# Altium footprint library 元件1.PcbLib: 420 footprints (part 16 of 27)
Each footprint in its own frame and in the unit in brackets; x right, y up, seen from the top. Pads: shape width x height; smd on the part's side, far side on the other; paste and mask are expansions set on the pad; w line width, h text height; cw(c..) or ccw(c..) is an arc to the next point about the centre after c.
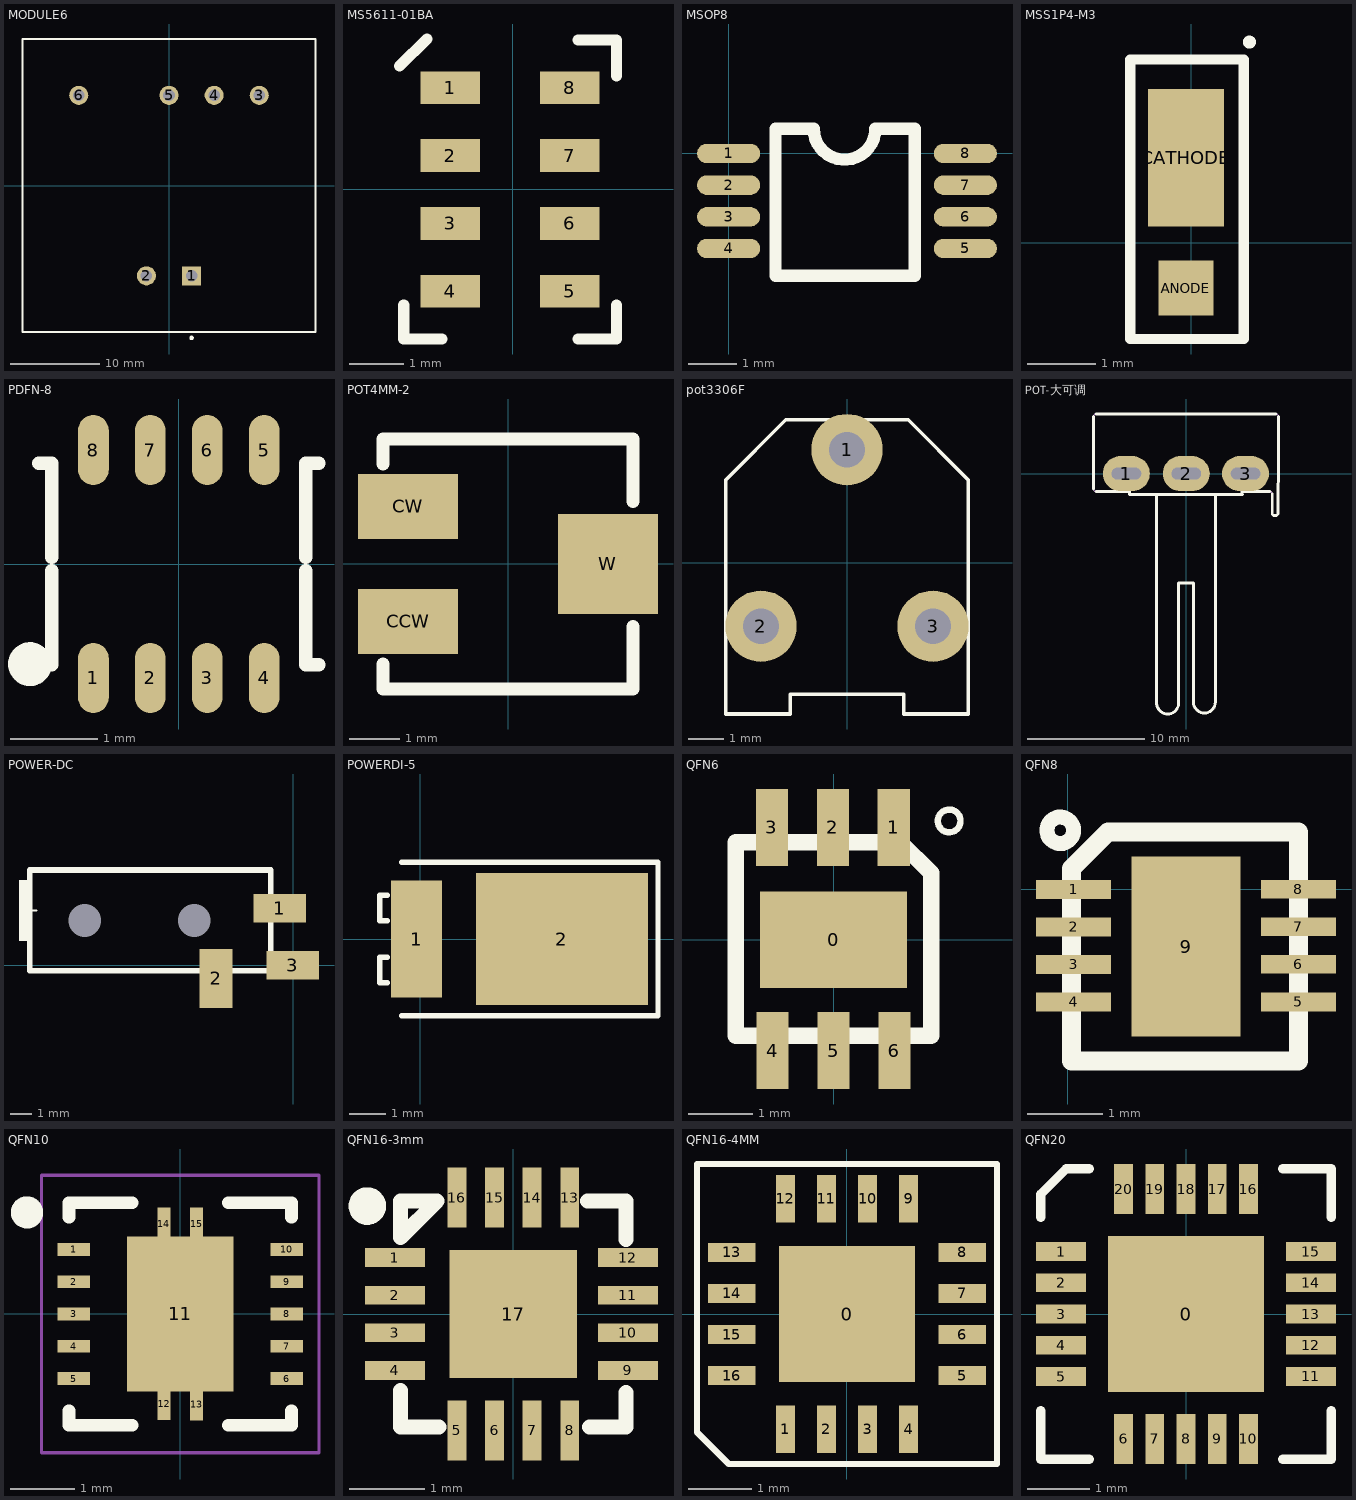
[diagram p15: the footprints below, top view; thin cyan lines are the x and y axes]

## MODULE6 [mm] "DIP; 6 Round Pins; Row Space 20.32 mm; Pitch 2.54 mm"
height 16.5
pads (6):
  rect 2.15x2.15 hole 1.3: 1(2.54,-10.16)
  round 2.15 hole 1.3: 2(-2.54,-10.16) 3(10.16,10.16) 4(5.08,10.16) 5(0,10.16) 6(-10.16,10.16)
Top Overlay:
  circle w0.25: c2.54,-17.15 r0.125
  lines w0.2: -16.5,-16.5 16.5,-16.5 16.5,16.5 -16.5,16.5 -16.5,-16.5
3D body "MODULE6.STEP": height 10, standoff 0, extent -16.602,-16.363 16.398,16.637

## MS5611-01BA [mm] "BAROMETER"
pads (8):
  rect 1.1x0.6 smd: 1(-1.153,1.867) 2(-1.153,0.617) 3(-1.153,-0.633) 4(-1.153,-1.883) 5(1.047,-1.883) 6(1.047,-0.633) 7(1.047,0.617) 8(1.047,1.867)
Top Overlay:
  lines w0.203: -2.083,2.261 -1.583,2.761 ; -2.007,-2.134 -2.007,-2.758 -1.303,-2.758 ; 1.197,-2.758 1.905,-2.758 1.905,-2.134 ; 1.197,2.742 1.905,2.742 1.905,2.083
3D body "User Library-MS5611-01BA03.STEP": height 1, standoff -0.05, extent -1.55,-2.54 1.45,2.46

## MSOP8 [mm] "VSOP8"
pads (8):
  oval 1.3x0.4 smd: 1(0,0) 2(0,-0.652) 3(0,-1.304) 4(0,-1.956) 5(4.877,-1.956) 6(4.877,-1.304) 7(4.877,-0.652) 8(4.877,0)
Top Overlay:
  lines w0.254: 0.965,-2.515 3.835,-2.515 3.835,0.508 3.023,0.508 cw(c2.388,0.508) 1.753,0.508 0.965,0.508 0.965,-2.515
3D body "SW3dPS-MSOP8.STEP": height 1.05, standoff -0.05, extent -0.03,-2.54 4.907,0.56

## MSS1P4-M3 [mm] "DIODE-SCHOTTKY_MSMP"
pads (2):
  rect 0.8x0.8 smd: ANODE(-0.078,-0.658)
  rect 1.1x2 smd: CATHODE(-0.078,1.242)
Top Overlay:
  circle w0.1: c0.844,2.921 r0.045
  lines w0.15: -0.889,-1.397 0.762,-1.397 0.762,2.667 -0.889,2.667 -0.889,-1.397
3D body "User Library-MicroSMP-2.STEP": height 0.73, standoff 0, extent -0.76,-0.79 0.64,1.91

## PDFN-8 [mm]
height 0.9
pads (8):
  oval 0.35x0.8 smd: 1(-0.975,-1.3) 2(-0.325,-1.3) 3(0.325,-1.3) 4(0.975,-1.3) 5(0.975,1.3) 6(0.325,1.3) 7(-0.325,1.3) 8(-0.975,1.3)
Top Overlay:
  circle w0.25: c-1.7,-1.143 r0.125
  lines w0.152: -1.6,1.15 -1.45,1.15 -1.45,0.075 ; -1.45,-1.15 -1.45,-0.075 ; 1.45,-0.075 1.45,-1.15 1.6,-1.15 ; 1.45,0.075 1.45,1.15 1.6,1.15
3D body "PDFN-8.STEP": height 0.9, standoff 0, extent -1.549,-1.4 1.551,1.4

## POT4MM-2 [mm] "Square Trimming Potentiometer"
pads (3):
  rect 2x1.3 smd: CCW(-2,-1.15) CW(-2,1.15)
  rect 2x2 smd: W(2,0)
Top Overlay:
  lines w0.254: -2.5,-2 -2.5,-2.5 2.5,-2.5 2.5,-1.25 ; -2.5,2 -2.5,2.5 2.5,2.5 2.5,1.25
3D body "POT4MM-2.STEP": height 5.5, standoff 0, extent -2.489,-2.438 2.511,2.562

## pot3306F [mm]
pads (3):
  round 2 hole 1: 1(0,3.175) 2(-2.413,-1.778) 3(2.413,-1.778)
Top Overlay:
  lines w0.1: -2.611,-4.241 -1.595,-4.241 ; -2.964,-1.533 -2.964,-2.076 -2.084,-2.076 ; -2.964,-1.533 -2.084,-1.533 -2.084,-2.076 ; -2.964,-1.533 -3.405,-1.533 -3.405,-2.07 -2.964,-2.07 -2.964,-1.533 ; -2.084,-2.076 -1.595,-2.076 -1.595,-1.535 -2.084,-1.535 -2.084,-2.076 ; -1.595,-4.241 -1.595,-3.681 1.595,-3.681 1.595,-4.241 3.405,-4.241 3.405,-3.681 3.405,2.323 1.719,4.01 -1.719,4.01 -3.405,2.323 -3.405,-3.049 -3.405,-3.681 -3.405,-4.241 -1.595,-4.241 ; -0.464,3.474 -0.464,2.94 0.416,2.94 ; -0.464,3.474 0.416,3.474 0.416,2.94 ; -0.464,3.474 -0.905,3.474 -0.905,2.938 -0.464,2.938 -0.464,3.474 ; 0.416,2.94 0.905,2.94 0.905,3.479 0.416,3.479 0.416,2.94 ; 2.036,-1.533 2.036,-2.076 2.916,-2.076 ; 2.036,-1.533 2.916,-1.533 2.916,-2.076 ; 2.036,-1.533 1.595,-1.533 1.595,-2.07 2.036,-2.07 2.036,-1.533 ; 2.916,-2.076 3.405,-2.076 3.405,-1.535 2.916,-1.535 2.916,-2.076
3D body "User Library-Trimmer, 3306F-1.STEP": height 7.62, standoff -3.04, extent -3.302,-4.191 3.508,4.061

## POT-大可调 [mm]
pads (3):
  oval 4x3 hole 1 slot 2.5 at 0 deg: 1(-5.104,0) 2(0,0) 3(5.05,0)
Top Overlay:
  lines w0.254: -7.899,-1.324 -7.899,0 -7.899,4.88 ; -7.699,-1.524 -7.524,-1.524 -6.342,-1.524 -4.979,-1.524 -4.829,-1.524 -4.829,-1.778 4.778,-1.778 ; -7.699,5.08 -6.883,5.08 6.757,5.08 7.649,5.08 ; -0.724,-0.25 0.673,-0.25 0.673,0.25 -0.724,0.25 -0.724,-0.228 ; 4.74,-1.778 4.74,-1.524 7.122,-1.524 ; 7.322,-3.429 7.322,-1.724 ; 7.449,-3.556 7.702,-3.556 ; 7.829,-3.429 7.829,-1.524 7.849,0 7.849,3.048 7.849,4.88 ; -5.804,-0.25 -5.804,0.25 -4.407,0.25 -4.407,-0.25 -5.804,-0.25 ; -2.521,-19.462 ccw(c-1.59,-19.544) -0.66,-19.462 -0.66,-9.302 0.61,-9.302 0.61,-19.462 ccw(c1.543,-19.462) 2.477,-19.462 2.477,-9.302 2.477,-1.778 -2.521,-1.778 -2.521,-9.302 -2.521,-19.462 ; 4.356,-0.25 4.356,0.25 5.753,0.25 5.753,-0.25 4.356,-0.25
Mechanical 6:
  lines w0.1: -7.899,-1.324 ccw(c-7.699,-1.324) -7.699,-1.524 ; -7.899,4.88 cw(c-7.699,4.88) -7.699,5.08 ; 7.122,-1.524 cw(c7.122,-1.724) 7.322,-1.724 ; 7.649,5.08 cw(c7.649,4.88) 7.849,4.88
3D body "User Library-Pot.STEP": height 20.62, standoff -4, extent -7.849,-20.433 7.899,5.135

## POWER-DC [mm]
pads (5):
  round 0 hole 1.5 mask+0: 0(-9.521,2.057) 0(-4.521,2.057)
  rect 2.4x1.3 smd: 1(-0.621,2.607) 3(-0.021,0.007)
  rect 1.5x2.7 smd: 2(-3.521,-0.593)
Top Overlay:
  rectangle: -12.521,1.107 -11.921,3.907
  lines w0.1: -12.221,2.507 -11.721,2.507
  lines w0.254: -12.021,-0.243 -1.021,-0.243 -1.021,4.357 -12.021,4.357 -12.021,-0.243
3D body "DC.STEP": height 4.4, standoff -0.8, extent -11.996,-1.818 0.604,4.482

## POWERDI-5 [mm]
pads (2):
  rect 1.4x3.2 smd: 1(-0.1,0)
  rect 4.7x3.6 smd: 2(3.87,0)
Top Overlay:
  lines w0.15: -0.9,-1.2 -1.1,-1.2 -1.1,-0.5 -0.9,-0.5 ; -0.9,0.5 -1.1,0.5 -1.1,1.2 -0.9,1.2 ; -0.5,-2.1 6.5,-2.1 6.5,2.1 -0.5,2.1
3D body "POWERDI-5.STEP": height 1.17, standoff 0.02, extent -0.5,-2.025 6.1,2.025

## QFN6 [mm] "SOT-23/SC-74A; 5 Leads; Body 3.1 x 3 mm, inc. leads (LxW max)"
height 1.45
pads (7):
  rect 2.3x1.5 smd: 0(0,0)
  rect 0.5x1.2 smd: 1(0.94,1.753) 2(-0.01,1.753) 3(-0.96,1.753) 4(-0.95,-1.727) 5(0,-1.727) 6(0.95,-1.727)
Top Overlay:
  circle w0.1: c1.804,1.854 r0.177
  lines w0.254: -1.524,-1.499 1.524,-1.499 1.524,1.041 1.041,1.524 -1.524,1.524 -1.524,-1.499
3D body: height 1, standoff 0, extent -1.524,-1.499 1.524,1.524

## QFN8 [mm] "SOT-23/SC-74A; 5 Leads; Body 3.1 x 3 mm, inc. leads (LxW max)"
height 1.45
pads (9):
  rect 1x0.25 smd: 1(0.076,0) 2(0.076,-0.5) 3(0.076,-1) 5(3.073,-1.499) 6(3.073,-0.999) 7(3.073,-0.499) 8(3.073,0.001)
  rect 1x0.25 smd paste+0: 4(0.076,-1.5)
  rect 1.45x2.4 smd: 9(1.575,-0.762)
Top Overlay:
  circle w0.2: c-0.101,0.787 r0.177
  lines w0.254: 0.051,-2.286 0.051,0.279 0.533,0.762 3.073,0.762 3.073,-2.286 0.051,-2.286
3D body: height 1, standoff 0, extent 0.051,-2.286 3.073,0.762

## QFN10 [mm] "QFN, 14-Leads, Body 3.00x3.00mm, Pitch 0.50mm, Thermal Pad 1.63x2.40mm, IPC Medium Density"
height 1
pads (15):
  rect 0.5x0.2 smd: 1(-1.65,1) 2(-1.65,0.5) 3(-1.65,0) 4(-1.65,-0.5) 5(-1.65,-1) 6(1.65,-1) 7(1.65,-0.5) 8(1.65,0) 9(1.65,0.5) 10(1.65,1)
  rect 1.65x2.4 smd: 11(0,0)
  rect 0.2x0.5 smd: 12(-0.25,-1.392) 13(0.254,-1.397) 14(-0.254,1.397) 15(0.254,1.397)
Top Overlay:
  circle w0.25: c-2.375,1.575 r0.125
  lines w0.2: -1.725,-1.5 -1.725,-1.725 -0.75,-1.725 ; -1.725,1.5 -1.725,1.725 -0.75,1.725 ; 0.75,-1.725 1.725,-1.725 1.725,-1.5 ; 0.75,1.725 1.725,1.725 1.725,1.5
Mechanical 15:
  lines w0.05: -2.15,-2.15 -2.15,2.15 2.15,2.15 2.15,-2.15 -2.15,-2.15
  lines w0.1: -0.5,0 0.5,0 ; 0,-0.5 0,0.5
3D body: height 0.2, standoff 0.05, extent -1.6,-1.092 -1.397,-0.914
3D body: height 0.2, standoff 0.05, extent -1.6,-0.584 -1.397,-0.406
3D body: height 0.2, standoff 0.05, extent -1.6,-0.102 -1.397,0.076
3D body: height 0.2, standoff 0.05, extent -1.6,0.406 -1.397,0.584
3D body: height 0.2, standoff 0.05, extent -1.6,0.914 -1.397,1.092
3D body: height 0.2, standoff 0.05, extent 1.397,0.914 1.6,1.092
3D body: height 0.2, standoff 0.05, extent 1.397,0.406 1.6,0.584
3D body: height 0.2, standoff 0.05, extent 1.397,-0.076 1.6,0.102
3D body: height 0.2, standoff 0.05, extent 1.397,-0.584 1.6,-0.406
3D body: height 0.2, standoff 0.05, extent 1.397,-1.092 1.6,-0.914
3D body: height 0.2, standoff 0.05, extent -0.356,1.397 -0.178,1.6
3D body: height 0.2, standoff 0.05, extent 0.152,1.397 0.33,1.6
3D body: height 0.2, standoff 0.05, extent -0.343,-1.6 -0.165,-1.397
3D body: height 0.2, standoff 0.05, extent 0.152,-1.6 0.33,-1.397
3D body: height 1, standoff 0.05, extent -1.575,-1.575 1.575,1.575

## QFN16-3mm [mm] "QFN, 16-Leads, Body 3.0x3.0mm (max), Pitch 0.50mm, IPC Low Density"
height 3
pads (17):
  rect 0.8x0.25 smd: 1(-1.575,0.75) 2(-1.575,0.25) 3(-1.575,-0.25) 4(-1.575,-0.75) 9(1.524,-0.75) 10(1.524,-0.25) 11(1.524,0.25) 12(1.524,0.75)
  rect 0.25x0.8 smd: 5(-0.75,-1.55) 6(-0.25,-1.55) 7(0.25,-1.55) 8(0.75,-1.55) 13(0.75,1.55) 14(0.25,1.55) 15(-0.25,1.55) 16(-0.75,1.55)
  rect 1.7x1.7 smd: 17(0,0)
Top Overlay:
  circle w0.25: c-1.941,1.436 r0.125
  lines w0.2: -1.5,-1.015 -1.5,-1.5 -0.989,-1.5 ; 0.989,1.5 1.5,1.5 1.5,0.989 ; 1.016,-1.5 1.5,-1.5 1.5,-1.041 ; -1.5,1.016 -1.5,1.5 -1.016,1.5 -1.5,1.016
3D body "QFN-16_3x3.STEP": height 0.9, standoff 0, extent -1.549,-1.521 1.493,1.521

## QFN16-4MM [mm] "LNA"
height 5.33
pads (17):
  rect 2.15x2.15 smd: 0(0,0)
  rect 0.3x0.75 smd: 1(-0.975,-1.825) 2(-0.325,-1.825) 3(0.325,-1.825) 4(0.975,-1.825) 9(0.975,1.825) 10(0.325,1.825) 11(-0.325,1.825) 12(-0.975,1.825)
  rect 0.75x0.3 smd: 5(1.825,-0.975) 6(1.825,-0.325) 7(1.825,0.325) 8(1.825,0.975) 13(-1.825,0.975) 14(-1.825,0.325) 15(-1.825,-0.325) 16(-1.825,-0.975)
Top Overlay:
  lines w0.1: -1.025,2.375 2.375,2.375 2.375,-2.375 -1.525,-2.375 -1.875,-2.375 -2.375,-1.875 -2.375,-1.425 -2.375,2.375 -0.4,2.375
3D body "QFN16.step": height 0.85, standoff 0, extent -2.001,-1.981 2.001,2.021

## QFN20 [mm]
pads (21):
  rect 2.5x2.5 smd: 0(0,0)
  rect 0.8x0.3 smd: 1(-2,1) 2(-2,0.5) 3(-2,0) 4(-2,-0.5) 5(-2,-1) 11(2,-1) 12(2,-0.5) 13(2,0) 14(2,0.5) 15(2,1)
  rect 0.3x0.8 smd: 6(-1,-2) 7(-0.5,-2) 8(0,-2) 9(0.5,-2) 10(1,-2) 16(1,2) 17(0.5,2) 18(0,2) 19(-0.5,2) 20(-1,2)
Top Overlay:
  lines w0.15: -2.325,-1.55 -2.325,-2.325 -1.55,-2.325 ; -2.325,1.55 -2.325,1.917 -1.917,2.325 -1.55,2.325 ; 1.55,-2.325 2.325,-2.325 2.325,-1.55 ; 1.55,2.325 2.325,2.325 2.325,1.55
3D body "QFN-20.STEP": height 0.62, standoff -0.08, extent -1.501,-1.5 1.499,1.5